# Altium footprint library PCB_CONNECTORS.PcbLib: 676 footprints (part 14 of 43)
Each footprint in its own frame and in the unit in brackets; x right, y up, seen from the top. Pads: shape width x height; smd on the part's side, far side on the other; paste and mask are expansions set on the pad; w line width, h text height; cw(c..) or ccw(c..) is an arc to the next point about the centre after c.
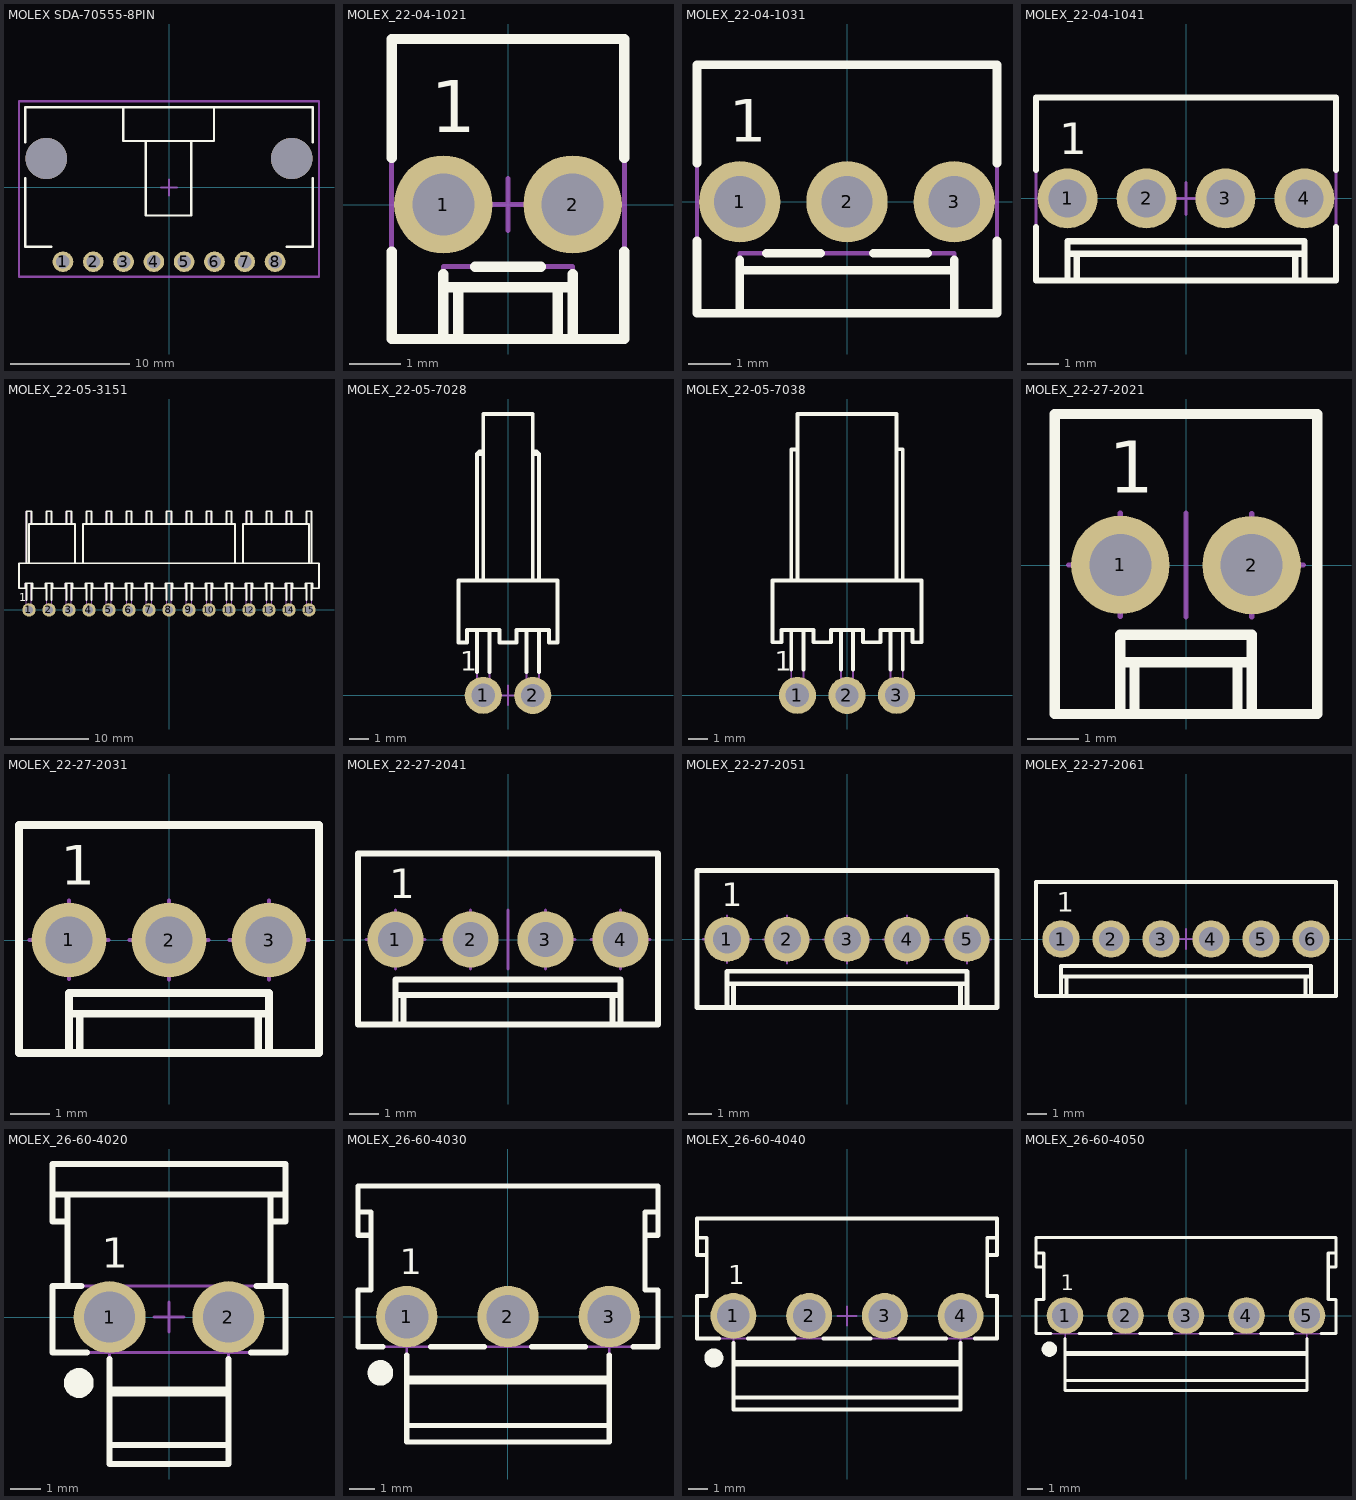
[diagram p13: the footprints below, top view; thin cyan lines are the x and y axes]

## MOLEX SDA-70555-8PIN [mm] "SL Right Angle Header W/LAtch & Trip-Pegs 2.54mm Centres"
height 6.99
pads (8):
  round 1.73 hole 1.13: 1(-8.89,-6.223) 2(-6.35,-6.223) 3(-3.81,-6.223) 4(-1.27,-6.223) 5(1.27,-6.223) 6(3.81,-6.223) 7(6.35,-6.223) 8(8.89,-6.223)
via -10.29,2.417 diameter 3.45 hole 3.45
via 10.29,2.417 diameter 3.45 hole 3.45
Top Overlay:
  lines w0.2: -12.05,0.777 -12.05,-4.953 -9.85,-4.953 ; -12.05,3.777 -12.05,6.731 12.05,6.731 12.05,3.777 ; -3.85,6.731 -3.85,3.892 3.77,3.892 3.77,6.731 ; -1.945,3.892 -1.945,-2.346 1.865,-2.346 1.865,3.892 ; 9.85,-4.953 12.05,-4.953 12.05,0.777
Mechanical 15:
  lines w0.2: -0.635,0 0.635,0 ; 0,-0.635 0,0.635 ; -12.573,-7.493 -12.573,7.239 12.573,7.239 12.573,-7.493 -12.573,-7.493
3D body "705550007.STEP": height 6.98, standoff -3.3, extent -12.065,-6.923 12.065,6.666

## MOLEX_22-04-1021 [mm] "2.5mm (.100\") Pitch KK® Header, Single Row, Vertical, 2 Circuits"
height 11.7
pads (2):
  round 1.9 hole 1.2: 1(-1.25,0) 2(1.25,0)
Top Overlay:
  lines w0.2: -2.25,-0.907 -2.25,-2.6 2.25,-2.6 2.25,-0.907 ; -2.25,0.907 -2.25,3.2 2.25,3.2 2.25,0.907 ; -1.25,-2.6 -1.25,-1.35 ; -1.25,-1.6 1.25,-1.6 ; -0.959,-2.6 -0.959,-1.6 ; -0.632,-1.2 0.632,-1.2 ; 0.959,-2.6 0.959,-1.6 ; 1.25,-2.6 1.25,-1.35
  text "1" at -1.49,1.397 h1
Mechanical 8:
  lines w0.1: -1.75,0 -1.25,0 ; -1.25,-0.5 -1.25,0 ; -1.25,0.5 -1.25,0 ; -0.75,0 -1.25,0 ; -0.5,0 0,0 ; 0,-0.5 0,0 ; 0,0.5 0,0 ; 0.5,0 0,0 ; 0.75,0 1.25,0 ; 1.25,-0.5 1.25,0 ; 1.25,0.5 1.25,0 ; 1.75,0 1.25,0
Mechanical 14:
  lines w0.1: -1.25,-2.6 -1.25,-1.2 1.25,-1.2 1.25,-2.6 ; -1.25,-1.6 1.25,-1.6 ; -0.959,-2.6 -0.959,-1.6 ; 0.959,-2.6 0.959,-1.6 ; -2.25,-2.6 2.25,-2.6 2.25,3.2 -2.25,3.2 -2.25,-2.6 ; -1.568,-0.318 -0.933,-0.318 -0.933,0.318 -1.568,0.318 -1.568,-0.318 ; 0.933,-0.318 0.933,0.318 1.568,0.318 1.568,-0.318 0.933,-0.318
  text "1" at -1.49,1.397 h1
3D body "MOLEX_22-04-1021.stp": height 11.7, standoff -3.4, extent -2.25,-2.6 2.25,3.2

## MOLEX_22-04-1031 [mm] "2.5mm (.100\") Pitch KK® Header, Single Row, Vertical, 3 Circuits"
height 11.7
pads (3):
  round 1.9 hole 1.2: 1(-2.5,0) 2(0,0) 3(2.5,0)
Top Overlay:
  lines w0.2: -3.5,-0.907 -3.5,-2.6 3.5,-2.6 3.5,-0.907 ; -3.5,0.907 -3.5,3.2 3.5,3.2 3.5,0.907 ; -2.5,-2.6 -2.5,-1.35 ; -2.5,-1.6 2.5,-1.6 ; -1.882,-1.2 -0.618,-1.2 ; 0.618,-1.2 1.882,-1.2 ; 2.5,-2.6 2.5,-1.35
  text "1" at -2.75,1.4 h1
Mechanical 8:
  lines w0.1: -3,0 -2.5,0 ; -2.5,-0.5 -2.5,0 ; -2.5,0.5 -2.5,0 ; -2,0 -2.5,0 ; -0.5,0 0,0 ; 0,-0.5 0,0 ; 0,0.5 0,0 ; 0.5,0 0,0 ; 2,0 2.5,0 ; 2.5,-0.5 2.5,0 ; 2.5,0.5 2.5,0 ; 3,0 2.5,0
Mechanical 14:
  lines w0.1: -2.5,-2.6 -2.5,-1.2 2.5,-1.2 2.5,-2.6 ; -2.5,-1.6 2.5,-1.6 ; -3.5,-2.6 3.5,-2.6 3.5,3.2 -3.5,3.2 -3.5,-2.6
  text "1" at -2.75,1.4 h1
3D body "MOLEX_22-04-1031.stp": height 11.7, standoff -3.4, extent -3.5,-2.6 3.5,3.2

## MOLEX_22-04-1041 [mm] "2.5mm (.100\") Pitch KK® Header, Single Row, Vertical, 4 Circuits"
height 11.7
pads (4):
  round 1.9 hole 1.2: 1(-3.75,0) 2(-1.25,0) 3(1.25,0) 4(3.75,0)
Top Overlay:
  lines w0.2: -4.75,-0.907 -4.75,-2.6 4.75,-2.6 4.75,-0.907 ; -4.75,0.907 -4.75,3.2 4.75,3.2 4.75,0.907 ; -3.75,-2.6 -3.75,-1.35 3.75,-1.35 3.75,-2.6 ; -3.75,-1.75 3.75,-1.75 ; -3.459,-2.6 -3.459,-1.75 ; 3.459,-2.6 3.459,-1.75
  text "1" at -4.02,1.395 h1
Mechanical 8:
  lines w0.1: -4.25,0 -3.75,0 ; -3.75,-0.5 -3.75,0 ; -3.75,0.5 -3.75,0 ; -3.25,0 -3.75,0 ; -1.75,0 -1.25,0 ; -1.25,-0.5 -1.25,0 ; -1.25,0.5 -1.25,0 ; -0.75,0 -1.25,0 ; -0.5,0 0,0 ; 0,-0.5 0,0 ; 0,0.5 0,0 ; 0.5,0 0,0 ; 0.75,0 1.25,0 ; 1.25,-0.5 1.25,0 ; 1.25,0.5 1.25,0 ; 1.75,0 1.25,0 ; 3.25,0 3.75,0 ; 3.75,-0.5 3.75,0 ; 3.75,0.5 3.75,0 ; 4.25,0 3.75,0
Mechanical 14:
  lines w0.1: -3.75,-2.6 -3.75,-1.35 3.75,-1.35 3.75,-2.6 ; -3.75,-1.75 3.75,-1.75 ; -3.459,-2.6 -3.459,-1.75 ; 3.459,-2.6 3.459,-1.75 ; -4.75,-2.6 4.75,-2.6 4.75,3.2 -4.75,3.2 -4.75,-2.6
  text "1" at -4.02,1.395 h1
3D body "MOLEX_22-04-1041.stp": height 11.7, standoff -3.4, extent -4.75,-2.6 4.75,3.2

## MOLEX_22-05-3151 [mm] "2.54mm (.100\") Pitch KK® Wire-To-Board Header, Right Angle, With Friction Lock, 15 Circuits"
height 6.6
pads (15):
  round 1.7 hole 1: 1(-17.78,0) 2(-15.24,0) 3(-12.7,0) 4(-10.16,0) 5(-7.62,0) 6(-5.08,0) 7(-2.54,0) 8(0,0) 9(2.54,0) 10(5.08,0) 11(7.62,0) 12(10.16,0) 13(12.7,0) 14(15.24,0) 15(17.78,0)
Top Overlay:
  lines w0.2: -18.098,1.25 -18.098,3.366 ; -18.098,5.906 -18.098,12.51 -17.463,12.51 -17.463,10.909 ; -17.78,5.906 -17.78,10.909 -11.938,10.909 -11.938,5.906 ; -17.463,1.25 -17.463,3.366 ; -15.558,1.25 -15.558,3.366 ; -15.558,10.909 -15.558,12.51 -14.923,12.51 -14.923,10.909 ; -14.923,1.25 -14.923,3.366 ; -13.018,1.25 -13.018,3.366 ; -13.018,10.909 -13.018,12.51 -12.383,12.51 -12.383,10.909 ; -12.383,1.25 -12.383,3.366 ; -10.922,5.906 -10.922,10.909 8.382,10.909 8.382,5.906 ; -10.478,1.25 -10.478,3.366 ; -10.478,10.909 -10.478,12.51 -9.843,12.51 -9.843,10.909 ; -9.843,1.25 -9.843,3.366 ; -7.938,1.25 -7.938,3.366 ; -7.938,10.909 -7.938,12.51 -7.303,12.51 -7.303,10.909 ; -7.303,1.25 -7.303,3.366 ; -5.398,1.25 -5.398,3.366 ; -5.398,10.909 -5.398,12.51 -4.763,12.51 -4.763,10.909 ; -4.763,1.25 -4.763,3.366 ; -2.858,1.25 -2.858,3.366 ; -2.858,10.909 -2.858,12.51 -2.222,12.51 -2.222,10.909 ; -2.222,1.25 -2.222,3.366 ; -0.318,1.25 -0.318,3.366 ; -0.318,10.909 -0.318,12.51 0.318,12.51 0.318,10.909 ; 0.318,1.25 0.318,3.366 ; 2.222,1.25 2.222,3.366 ; 2.222,10.909 2.222,12.51 2.858,12.51 2.858,10.909 ; 2.858,1.25 2.858,3.366 ; 4.763,1.25 4.763,3.366 ; 4.763,10.909 4.763,12.51 5.398,12.51 5.398,10.909 ; 5.398,1.25 5.398,3.366 ; 7.303,1.25 7.303,3.366 ; 7.303,10.909 7.303,12.51 7.938,12.51 7.938,10.909 ; 7.938,1.25 7.938,3.366 ; 9.398,5.906 9.398,10.909 17.78,10.909 17.78,5.906 ; 9.843,1.25 9.843,3.366 ; 9.843,10.909 9.843,12.51 10.478,12.51 10.478,10.909 ; 10.478,1.25 10.478,3.366 ; 12.383,1.25 12.383,3.366 ; 12.383,10.909 12.383,12.51 13.018,12.51 13.018,10.909 ; 13.018,1.25 13.018,3.366 ; 14.923,1.25 14.923,3.366 ; 14.923,10.909 14.923,12.51 15.558,12.51 15.558,10.909 ; 15.558,1.25 15.558,3.366 ; 17.463,1.25 17.463,3.366 ; 17.463,10.909 17.463,12.51 18.098,12.51 18.098,5.906 ; 18.098,1.25 18.098,3.366 ; -19.05,2.731 -19.05,5.906 19.05,5.906 19.05,2.731 18.225,2.731 18.225,3.366 17.336,3.366 17.336,2.731 15.685,2.731 15.685,3.366 14.796,3.366 14.796,2.731 13.145,2.731 13.145,3.366 12.256,3.366 12.256,2.731 10.605,2.731 10.605,3.366 9.716,3.366 9.716,2.731 8.065,2.731 8.065,3.366 7.176,3.366 7.176,2.731 5.525,2.731 5.525,3.366 4.636,3.366 4.636,2.731 2.985,2.731 2.985,3.366 2.095,3.366 2.095,2.731 0.445,2.731 0.445,3.366 -0.445,3.366 -0.445,2.731 -2.095,2.731 -2.095,3.366 -2.985,3.366 -2.985,2.731 -4.636,2.731 -4.636,3.366 -5.525,3.366 -5.525,2.731 -7.176,2.731 -7.176,3.366 -8.065,3.366 -8.065,2.731 -9.716,2.731 -9.716,3.366 -10.605,3.366 -10.605,2.731 -12.256,2.731 -12.256,3.366 -13.145,3.366 -13.145,2.731 -14.796,2.731 -14.796,3.366 -15.685,3.366 -15.685,2.731 -17.336,2.731 -17.336,3.366 -18.225,3.366 -18.225,2.731 -19.05,2.731
  text "1" at -19.028,1.12 h1
Mechanical 8:
  lines w0.1: -18.28,0 -17.78,0 ; -17.78,-0.5 -17.78,0 ; -17.78,0.5 -17.78,0 ; -17.28,0 -17.78,0 ; -15.74,0 -15.24,0 ; -15.24,-0.5 -15.24,0 ; -15.24,0.5 -15.24,0 ; -14.74,0 -15.24,0 ; -13.2,0 -12.7,0 ; -12.7,-0.5 -12.7,0 ; -12.7,0.5 -12.7,0 ; -12.2,0 -12.7,0 ; -10.66,0 -10.16,0 ; -10.16,-0.5 -10.16,0 ; -10.16,0.5 -10.16,0 ; -9.66,0 -10.16,0 ; -8.12,0 -7.62,0 ; -7.62,-0.5 -7.62,0 ; -7.62,0.5 -7.62,0 ; -7.12,0 -7.62,0 ; -5.58,0 -5.08,0 ; -5.08,-0.5 -5.08,0 ; -5.08,0.5 -5.08,0 ; -4.58,0 -5.08,0 ; -3.04,0 -2.54,0 ; -2.54,-0.5 -2.54,0 ; -2.54,0.5 -2.54,0 ; -2.04,0 -2.54,0 ; -0.5,0 0,0 ; 0,-0.5 0,0 ; 0,0.5 0,0 ; 0.5,0 0,0 ; 2.04,0 2.54,0 ; 2.54,-0.5 2.54,0 ; 2.54,0.5 2.54,0 ; 3.04,0 2.54,0 ; 4.58,0 5.08,0 ; 5.08,-0.5 5.08,0 ; 5.08,0.5 5.08,0 ; 5.58,0 5.08,0 ; 7.12,0 7.62,0 ; 7.62,-0.5 7.62,0 ; 7.62,0.5 7.62,0 ; 8.12,0 7.62,0 ; 9.66,0 10.16,0 ; 10.16,-0.5 10.16,0 ; 10.16,0.5 10.16,0 ; 10.66,0 10.16,0 ; 12.2,0 12.7,0 ; 12.7,-0.5 12.7,0 ; 12.7,0.5 12.7,0 ; 13.2,0 12.7,0 ; 14.74,0 15.24,0 ; 15.24,-0.5 15.24,0 ; 15.24,0.5 15.24,0 ; 15.74,0 15.24,0 ; 17.28,0 17.78,0 ; 17.78,-0.5 17.78,0 ; 17.78,0.5 17.78,0 ; 18.28,0 17.78,0
Mechanical 14:
  drawing of 163 lines, arcs and shapes, not listed
  text "1" at -19.028,1.12 h1
3D body "MOLEX_22-05-3151.stp": height 6.35, standoff -3.58, extent -19.05,-0.317 19.05,12.51

## MOLEX_22-05-7028 [mm] "2.54mm (.100\") Pitch KK® Wire-To-Board Header, Right Angle, With Friction Lock, 2 Circuits"
height 5.8
pads (2):
  round 1.9 hole 1.2: 1(-1.27,0.002) 2(1.27,-0.002)
Top Overlay:
  lines w0.2: -1.587,1.209 -1.587,3.355 ; -1.587,5.895 -1.587,12.368 ; -1.27,5.895 -1.27,14.42 1.27,14.42 1.27,5.895 ; -1.27,12.368 -1.587,12.368 ; -1.27,12.495 -1.46,12.495 -1.587,12.368 ; -0.953,1.209 -0.953,3.355 ; 0.953,1.209 0.953,3.355 ; 1.27,12.368 1.587,12.368 ; 1.27,12.495 1.46,12.495 1.587,12.368 ; 1.587,1.209 1.587,3.355 ; 1.587,5.895 1.587,12.368 ; -2.54,2.72 -2.095,2.72 -2.095,3.355 -0.445,3.355 -0.445,2.72 0.445,2.72 0.445,3.355 2.095,3.355 2.095,2.72 2.54,2.72 2.54,5.895 -2.54,5.895 -2.54,2.72
  text "1" at -2.442,1.27 h1
Mechanical 8:
  lines w0.1: -1.77,0 -1.27,0 ; -1.27,-0.5 -1.27,0 ; -1.27,0.5 -1.27,0 ; -0.77,0 -1.27,0 ; -0.5,0 0,0 ; 0,-0.5 0,0 ; 0,0.5 0,0 ; 0.5,0 0,0 ; 0.77,0 1.27,0 ; 1.27,-0.5 1.27,0 ; 1.27,0.5 1.27,0 ; 1.77,0 1.27,0
Mechanical 14:
  lines w0.1: -1.587,3.355 -1.587,-0.318 -0.953,-0.318 -0.953,3.355 ; -1.587,5.895 -1.587,12.368 ; -1.27,5.895 -1.27,14.42 1.27,14.42 1.27,5.895 ; -1.27,12.368 -1.587,12.368 ; -1.27,12.495 -1.46,12.495 -1.587,12.368 ; 0.953,3.355 0.953,-0.318 1.587,-0.318 1.587,3.355 ; 1.27,12.368 1.587,12.368 ; 1.27,12.495 1.46,12.495 1.587,12.368 ; 1.587,5.895 1.587,12.368 ; -2.54,2.72 -2.095,2.72 -2.095,3.355 -0.445,3.355 -0.445,2.72 0.445,2.72 0.445,3.355 2.095,3.355 2.095,2.72 2.54,2.72 2.54,5.895 -2.54,5.895 -2.54,2.72
  text "1" at -2.442,1.27 h1
3D body "MOLEX_22-05-7028.stp": height 5.84, standoff -3.8, extent -2.54,-0.317 2.54,14.42

## MOLEX_22-05-7038 [mm] "2.54mm (.100\") Pitch KK® Wire-To-Board Header, Right Angle, With Friction Lock, 3 Circuits"
height 5.8
pads (3):
  round 1.9 hole 1.2: 1(-2.54,0) 2(0,-0.005) 3(2.54,0)
Top Overlay:
  lines w0.2: -2.858,1.312 -2.858,3.355 ; -2.858,5.895 -2.858,12.605 -2.54,12.605 ; -2.54,5.895 -2.54,14.42 2.54,14.42 2.54,5.895 ; -2.222,1.312 -2.222,3.355 ; -0.318,1.312 -0.318,3.355 ; 0.318,1.312 0.318,3.355 ; 2.222,1.312 2.222,3.355 ; 2.54,12.634 2.858,12.605 2.858,5.895 ; 2.858,1.312 2.858,3.355 ; -3.81,2.72 -3.81,5.895 ; -3.81,2.72 -3.366,2.72 -3.366,3.355 -1.714,3.355 -1.714,2.72 -0.826,2.72 -0.826,3.355 0.826,3.355 0.826,2.72 1.714,2.72 1.714,3.355 3.366,3.355 3.366,2.72 3.81,2.72 3.81,5.895 -3.81,5.895 ; -3.81,2.72 -3.81,5.895
  text "1" at -3.712,1.268 h1
Mechanical 8:
  lines w0.1: -3.04,0 -2.54,0 ; -2.54,-0.5 -2.54,0 ; -2.54,0.5 -2.54,0 ; -2.04,0 -2.54,0 ; -0.5,0 0,0 ; 0,-0.5 0,0 ; 0,0.5 0,0 ; 0.5,0 0,0 ; 2.04,0 2.54,0 ; 2.54,-0.5 2.54,0 ; 2.54,0.5 2.54,0 ; 3.04,0 2.54,0
Mechanical 14:
  lines w0.1: -2.858,3.355 -2.858,-0.318 -2.222,-0.318 -2.222,3.355 ; -2.858,5.895 -2.858,12.605 -2.54,12.605 ; -2.54,5.895 -2.54,14.42 2.54,14.42 2.54,5.895 ; -0.318,3.355 -0.318,-0.318 0.318,-0.318 0.318,3.355 ; 2.222,3.355 2.222,-0.318 2.858,-0.318 2.858,3.355 ; 2.54,12.634 2.858,12.605 2.858,5.895 ; -3.81,2.72 -3.81,5.895 ; -3.81,2.72 -3.366,2.72 -3.366,3.355 -1.714,3.355 -1.714,2.72 -0.826,2.72 -0.826,3.355 0.826,3.355 0.826,2.72 1.714,2.72 1.714,3.355 3.366,3.355 3.366,2.72 3.81,2.72 3.81,5.895 -3.81,5.895 ; -3.81,2.72 -3.81,5.895
  text "1" at -3.712,1.268 h1
3D body "MOLEX_22-05-7038.stp": height 5.84, standoff -3.8, extent -3.81,-0.317 3.81,14.42

## MOLEX_22-27-2021 [mm] "2.54mm (.100\") Pitch KK® Header, Single Row, Vertical, 2 Circuits"
height 11.7
pads (2):
  round 1.9 hole 1.2: 1(-1.27,0.002) 2(1.27,-0.002)
Top Overlay:
  lines w0.2: -1.27,-2.88 -1.27,-1.35 1.27,-1.35 1.27,-2.88 ; -1.27,-1.88 1.27,-1.88 ; -0.997,-2.88 -0.997,-1.88 ; 0.997,-2.88 0.997,-1.88 ; -2.54,-2.88 2.54,-2.88 2.54,2.92 -2.54,2.92 -2.54,-2.88
  text "1" at -1.49,1.397 h1
Mechanical 8:
  lines w0.1: -2.27,0.002 -1.27,0.002 ; -1.27,-0.998 -1.27,0.002 ; -1.27,1.002 -1.27,0.002 ; 0,-1 0,0 0,1 ; 1.27,-1.002 1.27,-0.002 ; 1.27,0.998 1.27,-0.002 ; 2.27,-0.002 1.27,-0.002
Mechanical 14:
  lines w0.1: -1.27,-2.88 -1.27,-1.35 1.27,-1.35 1.27,-2.88 ; -1.27,-1.88 1.27,-1.88 ; -0.997,-2.88 -0.997,-1.88 ; 0.997,-2.88 0.997,-1.88 ; -2.54,-2.88 2.54,-2.88 2.54,2.92 -2.54,2.92 -2.54,-2.88 ; -1.59,-0.315 -0.95,-0.315 -0.95,0.32 -1.59,0.32 -1.59,-0.315 ; 0.95,-0.32 0.95,0.32 1.59,0.32 1.59,-0.32 0.95,-0.32
  text "1" at -1.49,1.397 h1
3D body "MOLEX_22-27-2021.stp": height 11.7, standoff -3.56, extent -2.54,-2.88 2.54,2.92

## MOLEX_22-27-2031 [mm] "2.54mm (.100\") Pitch KK® Header, Single Row, Vertical, 3 Circuits"
height 11.7
pads (3):
  round 1.9 hole 1.2: 1(-2.54,0.005) 2(0,0) 3(2.54,0)
Top Overlay:
  lines w0.2: -2.54,-2.873 -2.54,-1.342 2.54,-1.342 2.54,-2.873 ; -2.54,-1.873 2.54,-1.873 ; -2.267,-2.873 -2.267,-1.873 ; 2.267,-2.873 2.267,-1.873 ; -3.81,-2.873 3.81,-2.873 3.81,2.928 -3.81,2.928 -3.81,-2.873
  text "1" at -2.75,1.4 h1
Mechanical 8:
  lines w0.1: -3.54,0.005 -2.54,0.005 ; -2.54,-0.995 -2.54,0.005 ; -2.54,1.005 -2.54,0.005 ; -1.54,0.005 -2.54,0.005 ; -1,0 0,0 ; 0,-1 0,0 ; 0,1 0,0 ; 1,0 0,0 ; 1.54,0 2.54,0 ; 2.54,-1 2.54,0 ; 2.54,1 2.54,0 ; 3.54,0 2.54,0
Mechanical 14:
  lines w0.1: -2.86,-0.312 -2.22,-0.312 -2.22,0.327 -2.86,0.327 -2.86,-0.308 ; -2.54,-2.873 -2.54,-1.342 2.54,-1.342 2.54,-2.873 ; -2.54,-1.873 2.54,-1.873 ; -2.267,-2.873 -2.267,-1.873 ; -0.32,-0.318 0.32,-0.318 0.32,0.323 -0.32,0.323 -0.32,-0.312 ; 2.22,-0.318 2.86,-0.318 2.86,0.323 2.22,0.323 2.22,-0.312 ; 2.267,-2.873 2.267,-1.873 ; -3.81,-2.873 3.81,-2.873 3.81,2.928 -3.81,2.928 -3.81,-2.873
  text "1" at -2.75,1.4 h1
3D body "MOLEX_22-27-2031.stp": height 11.7, standoff -3.56, extent -3.81,-2.873 3.81,2.927

## MOLEX_22-27-2041 [mm] "2.54mm (.100\") Pitch KK® Header, Single Row, Vertical, 4 Circuits"
height 11.7
pads (4):
  round 1.9 hole 1.2: 1(-3.81,0) 2(-1.27,0) 3(1.27,0) 4(3.81,0)
Top Overlay:
  lines w0.2: -3.81,-2.883 -3.81,-1.353 3.81,-1.353 3.81,-2.883 ; -3.81,-1.883 3.81,-1.883 ; -3.537,-2.883 -3.537,-1.883 ; 3.537,-2.883 3.537,-1.883 ; -5.08,-2.883 -5.08,2.918 5.08,2.918 5.08,-2.883 -5.08,-2.883
  text "1" at -4.02,1.395 h1
Mechanical 8:
  lines w0.1: -4.81,0 -3.81,0 ; -3.81,-1 -3.81,0 ; -3.81,1 -3.81,0 ; -2.81,0 -3.81,0 ; -2.27,0 -1.27,0 ; -1.27,-1 -1.27,0 ; -1.27,1 -1.27,0 ; 0,-1 0,0 0,1 ; 1.27,-1 1.27,0 ; 1.27,1 1.27,0 ; 2.27,0 1.27,0 ; 2.81,0 3.81,0 ; 3.81,-1 3.81,0 ; 3.81,1 3.81,0 ; 4.81,0 3.81,0
Mechanical 14:
  lines w0.1: -3.81,-2.883 -3.81,-1.353 3.81,-1.353 3.81,-2.883 ; -3.81,-1.883 3.81,-1.883 ; -3.537,-2.883 -3.537,-1.883 ; 3.537,-2.883 3.537,-1.883 ; -5.08,-2.883 -5.08,2.918 5.08,2.918 5.08,-2.883 -5.08,-2.883 ; -4.13,-0.318 -3.49,-0.318 -3.49,0.318 -4.13,0.318 -4.13,-0.318 ; -1.59,-0.318 -0.95,-0.318 -0.95,0.318 -1.59,0.318 -1.59,-0.318 ; 0.95,-0.318 1.59,-0.318 1.59,0.318 0.95,0.318 0.95,-0.318 ; 3.49,-0.318 4.13,-0.318 4.13,0.318 3.49,0.318 3.49,-0.318
  text "1" at -4.02,1.395 h1
3D body "MOLEX_22-27-2041.stp": height 11.7, standoff -3.56, extent -5.08,-2.883 5.08,2.917

## MOLEX_22-27-2051 [mm] "2.54mm (.100\") Pitch KK® Header, Single Row, Vertical, 5 Circuits"
height 11.7
pads (5):
  round 1.9 hole 1.2: 1(-5.08,0.005) 2(-2.54,0) 3(0,0) 4(2.54,0) 5(5.08,0)
Top Overlay:
  lines w0.2: -5.08,-2.88 -5.08,-1.35 5.08,-1.35 5.08,-2.88 ; -5.08,-1.88 5.08,-1.88 ; -4.807,-2.88 -4.807,-1.88 ; 4.807,-2.88 4.807,-1.88 ; -6.35,-2.88 -6.35,2.92 6.35,2.92 6.35,-2.88 -6.35,-2.88
  text "1" at -5.3,1.4 h1
Mechanical 8:
  lines w0.1: -6.08,0.005 -5.08,0.005 ; -5.08,-0.995 -5.08,0.005 ; -5.08,1.005 -5.08,0.005 ; -4.08,0.005 -5.08,0.005 ; -3.54,0 -2.54,0 ; -2.54,-1 -2.54,0 ; -2.54,1 -2.54,0 ; -1.54,0 -2.54,0 ; -1,0 0,0 ; 0,-1 0,0 ; 0,1 0,0 ; 1,0 0,0 ; 1.54,0 2.54,0 ; 2.54,-1 2.54,0 ; 2.54,1 2.54,0 ; 3.54,0 2.54,0 ; 4.08,0 5.08,0 ; 5.08,-1 5.08,0 ; 5.08,1 5.08,0 ; 6.08,0 5.08,0
Mechanical 14:
  lines w0.1: -5.08,-2.88 -5.08,-1.35 5.08,-1.35 5.08,-2.88 ; -5.08,-1.88 5.08,-1.88 ; -4.807,-2.88 -4.807,-1.88 ; 4.807,-2.88 4.807,-1.88 ; -6.35,-2.88 -6.35,2.92 6.35,2.92 6.35,-2.88 -6.35,-2.88 ; -5.4,-0.315 -4.76,-0.315 -4.76,0.325 -5.4,0.325 -5.4,-0.315 ; -2.86,-0.32 -2.86,0.32 -2.22,0.32 -2.22,-0.32 -2.86,-0.32 ; -0.32,-0.32 0.32,-0.32 0.32,0.32 -0.32,0.32 -0.32,-0.32 ; 2.22,-0.32 2.86,-0.32 2.86,0.32 2.22,0.32 2.22,-0.32 ; 4.76,-0.32 5.4,-0.32 5.4,0.32 4.76,0.32 4.76,-0.32
  text "1" at -5.3,1.4 h1
3D body "MOLEX_22-27-2051.stp": height 11.7, standoff -3.56, extent -6.35,-2.88 6.35,2.92

## MOLEX_22-27-2061 [mm] "2.54mm (.100\") Pitch KK® Header, Single Row, Vertical, 6 Circuits"
height 11.7
pads (6):
  round 1.9 hole 1.2: 1(-6.35,0) 2(-3.81,0) 3(-1.27,0) 4(1.27,0) 5(3.81,0) 6(6.35,0)
Top Overlay:
  lines w0.2: -6.35,-2.9 -6.35,-1.37 6.35,-1.37 6.35,-2.9 ; -6.35,-1.9 6.35,-1.9 ; -6.077,-2.9 -6.077,-1.9 ; 6.077,-2.9 6.077,-1.9 ; -7.62,-2.9 7.62,-2.9 7.62,2.9 -7.62,2.9 -7.62,-2.9
  text "1" at -6.57,1.395 h1
Mechanical 8:
  lines w0.1: -6.85,0 -6.35,0 ; -6.35,-0.5 -6.35,0 ; -6.35,0.5 -6.35,0 ; -5.85,0 -6.35,0 ; -4.31,0 -3.81,0 ; -3.81,-0.5 -3.81,0 ; -3.81,0.5 -3.81,0 ; -3.31,0 -3.81,0 ; -1.77,0 -1.27,0 ; -1.27,-0.5 -1.27,0 ; -1.27,0.5 -1.27,0 ; -0.77,0 -1.27,0 ; -0.5,0 0,0 ; 0,-0.5 0,0 ; 0,0.5 0,0 ; 0.5,0 0,0 ; 0.77,0 1.27,0 ; 1.27,-0.5 1.27,0 ; 1.27,0.5 1.27,0 ; 1.77,0 1.27,0 ; 3.31,0 3.81,0 ; 3.81,-0.5 3.81,0 ; 3.81,0.5 3.81,0 ; 4.31,0 3.81,0 ; 5.85,0 6.35,0 ; 6.35,-0.5 6.35,0 ; 6.35,0.5 6.35,0 ; 6.85,0 6.35,0
Mechanical 14:
  lines w0.1: -6.35,-2.9 -6.35,-1.37 6.35,-1.37 6.35,-2.9 ; -6.35,-1.9 6.35,-1.9 ; -6.077,-2.9 -6.077,-1.9 ; 6.077,-2.9 6.077,-1.9 ; -7.62,-2.9 7.62,-2.9 7.62,2.9 -7.62,2.9 -7.62,-2.9 ; -6.67,-0.34 -6.67,0.3 -6.03,0.3 -6.03,-0.34 -6.67,-0.34 ; -4.13,-0.34 -3.49,-0.34 -3.49,0.3 -4.13,0.3 -4.13,-0.34 ; -1.59,-0.34 -1.59,0.3 -0.95,0.3 -0.95,-0.34 -1.59,-0.34 ; 0.95,-0.34 0.95,0.3 1.59,0.3 1.59,-0.34 0.95,-0.34 ; 3.49,-0.34 4.13,-0.34 4.13,0.3 3.49,0.3 3.49,-0.34 ; 6.03,-0.34 6.67,-0.34 6.67,0.3 6.03,0.3 6.03,-0.34
  text "1" at -6.57,1.395 h1
3D body "MOLEX_22-27-2061.stp": height 11.7, standoff -3.56, extent -7.62,-2.9 7.62,2.9

## MOLEX_26-60-4020 [mm] "3.96mm (.156\") Pitch KK® Solid Header, Vertical, Friction Lock, 2 Circuits, Tin (Sn) Plating"
height 14.73
pads (2):
  round 2.4 hole 1.7: 1(-1.981,0) 2(1.981,0)
Top Overlay:
  circle w0.5: c-3.011,-2.2 r0.25
  lines w0.2: -3.886,4.089 3.886,4.089 ; -3.378,1.041 -3.378,4.089 ; -3.378,3.182 -3.886,3.182 -3.886,5.105 3.886,5.105 3.886,3.182 3.378,3.182 ; -2.917,1.041 -3.886,1.041 -3.886,-1.181 -2.733,-1.181 ; -1.981,-4.267 1.981,-4.267 ; -1.981,-2.548 1.981,-2.548 ; -1.981,-2.413 1.981,-2.413 ; -1.981,-1.4 -1.981,-4.902 1.981,-4.902 1.981,-1.4 ; 2.733,-1.181 3.886,-1.181 3.886,1.041 2.917,1.041 ; 3.378,1.041 3.378,4.089
  text "1" at -2.249,1.65 h1
Mechanical 8:
  lines w0.1: -2.481,0 -1.981,0 ; -1.981,-0.5 -1.981,0 ; -1.981,0.5 -1.981,0 ; -1.481,0 -1.981,0 ; -0.5,0 0,0 ; 0,-0.5 0,0 ; 0,0.5 0,0 ; 0.5,0 0,0 ; 1.481,0 1.981,0 ; 1.981,-0.5 1.981,0 ; 1.981,0.5 1.981,0 ; 2.481,0 1.981,0
Mechanical 14:
  lines w0.1: -3.886,4.089 3.886,4.089 ; -3.378,1.041 -3.378,4.089 ; -3.378,3.182 -3.886,3.182 -3.886,5.105 3.886,5.105 3.886,3.182 3.378,3.182 ; -1.981,-4.267 1.981,-4.267 ; -1.981,-2.548 1.981,-2.548 ; -1.981,-2.413 1.981,-2.413 ; -1.981,-1.181 -1.981,-4.902 1.981,-4.902 1.981,-1.181 ; 2.55,-0.571 2.55,0.571 ; 3.378,1.041 3.378,4.089 ; -3.886,-1.181 -3.886,1.041 3.886,1.041 3.886,-1.181 -3.886,-1.181
  text "1" at -2.249,1.65 h1
3D body "MOLEX_26-60-4020.stp": height 14.73, standoff -3.56, extent -3.886,-4.902 3.886,5.105

## MOLEX_26-60-4030 [mm] "3.96mm (.156\") Pitch KK® Solid Header, Vertical, Friction Lock, 3 Circuits, Tin (Sn) Plating"
height 14.73
pads (3):
  round 2.4 hole 1.7: 1(-3.96,0) 2(0,0) 3(3.96,0)
Top Overlay:
  circle w0.5: c-4.99,-2.2 r0.25
  lines w0.2: -5.864,4.087 -5.356,4.087 -5.356,1.041 -5.864,1.041 -5.864,-1.18 -4.886,-1.18 ; -5.356,3.18 -5.864,3.18 -5.864,5.102 5.864,5.102 5.864,3.18 5.356,3.18 ; -3.96,-4.265 3.96,-4.265 ; -3.96,-2.546 3.96,-2.546 ; -3.96,-2.412 3.96,-2.412 ; -3.96,-1.5 -3.96,-4.899 3.96,-4.899 3.96,-1.5 ; -3.034,-1.18 -0.926,-1.18 ; 0.926,-1.18 3.034,-1.18 ; 4.886,-1.18 5.864,-1.18 5.864,1.041 5.356,1.041 5.356,4.087 5.864,4.087
  text "1" at -4.228,1.65 h1
Mechanical 8:
  lines w0.1: -4.46,0 -3.96,0 ; -3.96,-0.5 -3.96,0 ; -3.96,0.5 -3.96,0 ; -3.46,0 -3.96,0 ; -0.5,0 0,0 ; 0,-0.5 0,0 ; 0,0.5 0,0 ; 0.5,0 0,0 ; 3.46,0 3.96,0 ; 3.96,-0.5 3.96,0 ; 3.96,0.5 3.96,0 ; 4.46,0 3.96,0
Mechanical 14:
  lines w0.1: -5.864,4.087 -5.356,4.087 -5.356,1.041 -5.864,1.041 -5.864,-1.18 5.864,-1.18 5.864,1.041 5.356,1.041 5.356,4.087 5.864,4.087 ; -5.356,3.18 -5.864,3.18 -5.864,5.102 5.864,5.102 5.864,3.18 5.356,3.18 ; -3.96,-4.265 3.96,-4.265 ; -3.96,-2.546 3.96,-2.546 ; -3.96,-2.412 3.96,-2.412 ; -3.96,-1.18 -3.96,-4.899 3.96,-4.899 3.96,-1.18 ; -4.531,-0.571 -3.389,-0.571 -3.389,0.571 -4.531,0.571 -4.531,-0.571 ; -0.571,-0.571 0.571,-0.571 0.571,0.571 -0.571,0.571 -0.571,-0.571 ; 3.389,-0.571 4.531,-0.571 4.531,0.571 3.389,0.571 3.389,-0.571
  text "1" at -4.228,1.65 h1
3D body "MOLEX_26-60-4030.stp": height 14.73, standoff -3.56, extent -5.864,-4.899 5.871,5.108

## MOLEX_26-60-4040 [mm] "3.96mm (.156\") Pitch KK® Solid Header, Vertical, Friction Lock, 4 Circuits, Tin (Sn) Plating"
height 14.73
pads (4):
  round 2.4 hole 1.7: 1(-5.94,0) 2(-1.98,0) 3(1.98,0) 4(5.94,0)
Top Overlay:
  circle w0.5: c-6.97,-2.2 r0.25
  lines w0.2: -7.849,4.089 -7.341,4.089 -7.341,3.181 ; -6.691,-1.181 -7.849,-1.181 -7.849,1.041 -7.341,1.041 -7.341,3.181 ; -5.944,-4.268 5.944,-4.268 ; -5.944,-2.548 5.944,-2.548 ; -5.944,-2.413 5.944,-2.413 ; -5.944,-1.4 -5.944,-4.898 5.944,-4.903 5.944,-1.4 ; -5.189,-1.181 -2.731,-1.181 ; -1.229,-1.181 1.229,-1.181 ; 2.731,-1.181 5.189,-1.181 ; 6.691,-1.181 7.849,-1.181 7.849,1.041 7.341,1.041 7.341,3.181 ; 7.849,4.089 7.341,4.089 7.341,3.181 ; -7.341,3.181 -7.849,3.181 -7.849,5.105 7.849,5.105 7.849,3.181 7.341,3.181
  text "1" at -6.208,1.65 h1
Mechanical 8:
  lines w0.1: -6.44,0 -5.94,0 ; -5.94,-0.5 -5.94,0 ; -5.94,0.5 -5.94,0 ; -5.44,0 -5.94,0 ; -2.48,0 -1.98,0 ; -1.98,-0.5 -1.98,0 ; -1.98,0.5 -1.98,0 ; -1.48,0 -1.98,0 ; -0.5,0 0,0 ; 0,-0.5 0,0 ; 0,0.5 0,0 ; 0.5,0 0,0 ; 1.48,0 1.98,0 ; 1.98,-0.5 1.98,0 ; 1.98,0.5 1.98,0 ; 2.48,0 1.98,0 ; 5.44,0 5.94,0 ; 5.94,-0.5 5.94,0 ; 5.94,0.5 5.94,0 ; 6.44,0 5.94,0
Mechanical 14:
  lines w0.1: -7.849,4.089 -7.341,4.089 -7.341,3.181 ; -5.944,-4.268 5.944,-4.268 ; -5.944,-2.548 5.944,-2.548 ; -5.944,-2.413 5.944,-2.413 ; 7.849,4.089 7.341,4.089 7.341,3.181 ; -7.341,3.181 -7.849,3.181 -7.849,5.105 7.849,5.105 7.849,3.181 7.341,3.181 ; -7.341,3.181 -7.341,1.041 -7.849,1.041 -7.849,-1.181 -5.944,-1.181 ; -5.944,-1.181 5.944,-1.181 ; -5.944,-1.181 -5.944,-4.898 5.944,-4.903 5.944,-1.181 ; 5.944,-1.181 7.849,-1.181 7.849,1.041 7.341,1.041 7.341,3.181
  text "1" at -6.208,1.65 h1
3D body "MOLEX_26-60-4040.stp": height 14.73, standoff -3.54, extent -7.849,-4.902 7.849,5.105

## MOLEX_26-60-4050 [mm] "3.96mm (.156\") Pitch KK® Solid Header, Vertical, Friction Lock, 5 Circuits, Tin (Sn) Plating"
height 14.73
pads (5):
  round 2.4 hole 1.7: 1(-7.92,0) 2(-3.96,0) 3(0,0) 4(3.96,0) 5(7.92,0)
Top Overlay:
  circle w0.5: c-8.95,-2.2 r0.25
  lines w0.2: -9.824,4.087 -9.316,4.087 -9.316,1.041 -9.824,1.041 -9.824,-1.18 -8.846,-1.18 ; -9.316,3.18 -9.824,3.18 -9.824,5.102 9.824,5.102 9.824,3.18 9.316,3.18 ; -7.92,-4.265 7.92,-4.265 ; -7.92,-2.546 7.92,-2.546 ; -7.92,-2.412 7.92,-2.412 ; -7.92,-1.5 -7.92,-4.899 7.92,-4.899 7.92,-1.5 ; -6.994,-1.18 -4.886,-1.18 ; -3.034,-1.18 -0.926,-1.18 ; 0.926,-1.18 3.034,-1.18 ; 4.886,-1.18 6.994,-1.18 ; 8.846,-1.18 9.824,-1.18 9.824,1.041 9.316,1.041 9.316,4.087 9.824,4.087
  text "1" at -8.188,1.65 h1
Mechanical 8:
  lines w0.1: -8.42,0 -7.92,0 ; -7.92,-0.5 -7.92,0 ; -7.92,0.5 -7.92,0 ; -7.42,0 -7.92,0 ; -4.46,0 -3.96,0 ; -3.96,-0.5 -3.96,0 ; -3.96,0.5 -3.96,0 ; -3.46,0 -3.96,0 ; -0.5,0 0,0 ; 0,-0.5 0,0 ; 0,0.5 0,0 ; 0.5,0 0,0 ; 3.46,0 3.96,0 ; 3.96,-0.5 3.96,0 ; 3.96,0.5 3.96,0 ; 4.46,0 3.96,0 ; 7.42,0 7.92,0 ; 7.92,-0.5 7.92,0 ; 7.92,0.5 7.92,0 ; 8.42,0 7.92,0
Mechanical 14:
  lines w0.1: -9.824,4.087 -9.316,4.087 -9.316,1.041 -9.824,1.041 -9.824,-1.18 9.824,-1.18 9.824,1.041 9.316,1.041 9.316,4.087 9.824,4.087 ; -9.316,3.18 -9.824,3.18 -9.824,5.102 9.824,5.102 9.824,3.18 9.316,3.18 ; -7.92,-4.265 7.92,-4.265 ; -7.92,-2.546 7.92,-2.546 ; -7.92,-2.412 7.92,-2.412 ; -7.92,-1.18 -7.92,-4.899 7.92,-4.899 7.92,-1.18 ; -8.491,-0.571 -7.349,-0.571 -7.349,0.571 -8.491,0.571 -8.491,-0.571 ; -4.531,-0.571 -3.389,-0.571 -3.389,0.571 -4.531,0.571 -4.531,-0.571 ; -0.571,-0.571 0.571,-0.571 0.571,0.571 -0.571,0.571 -0.571,-0.571 ; 3.389,-0.571 4.531,-0.571 4.531,0.571 3.389,0.571 3.389,-0.571 ; 7.349,-0.571 8.491,-0.571 8.491,0.571 7.349,0.571 7.349,-0.571
  text "1" at -8.188,1.65 h1
3D body "MOLEX_26-60-4050.stp": height 14.72, standoff -3.55, extent -9.824,-4.899 9.824,5.102